# Altium footprint library LukaLIBRARY.PcbLib: 772 footprints (part 35 of 49)
Each footprint in its own frame and in the unit in brackets; x right, y up, seen from the top. Pads: shape width x height; smd on the part's side, far side on the other; paste and mask are expansions set on the pad; w line width, h text height; cw(c..) or ccw(c..) is an arc to the next point about the centre after c.
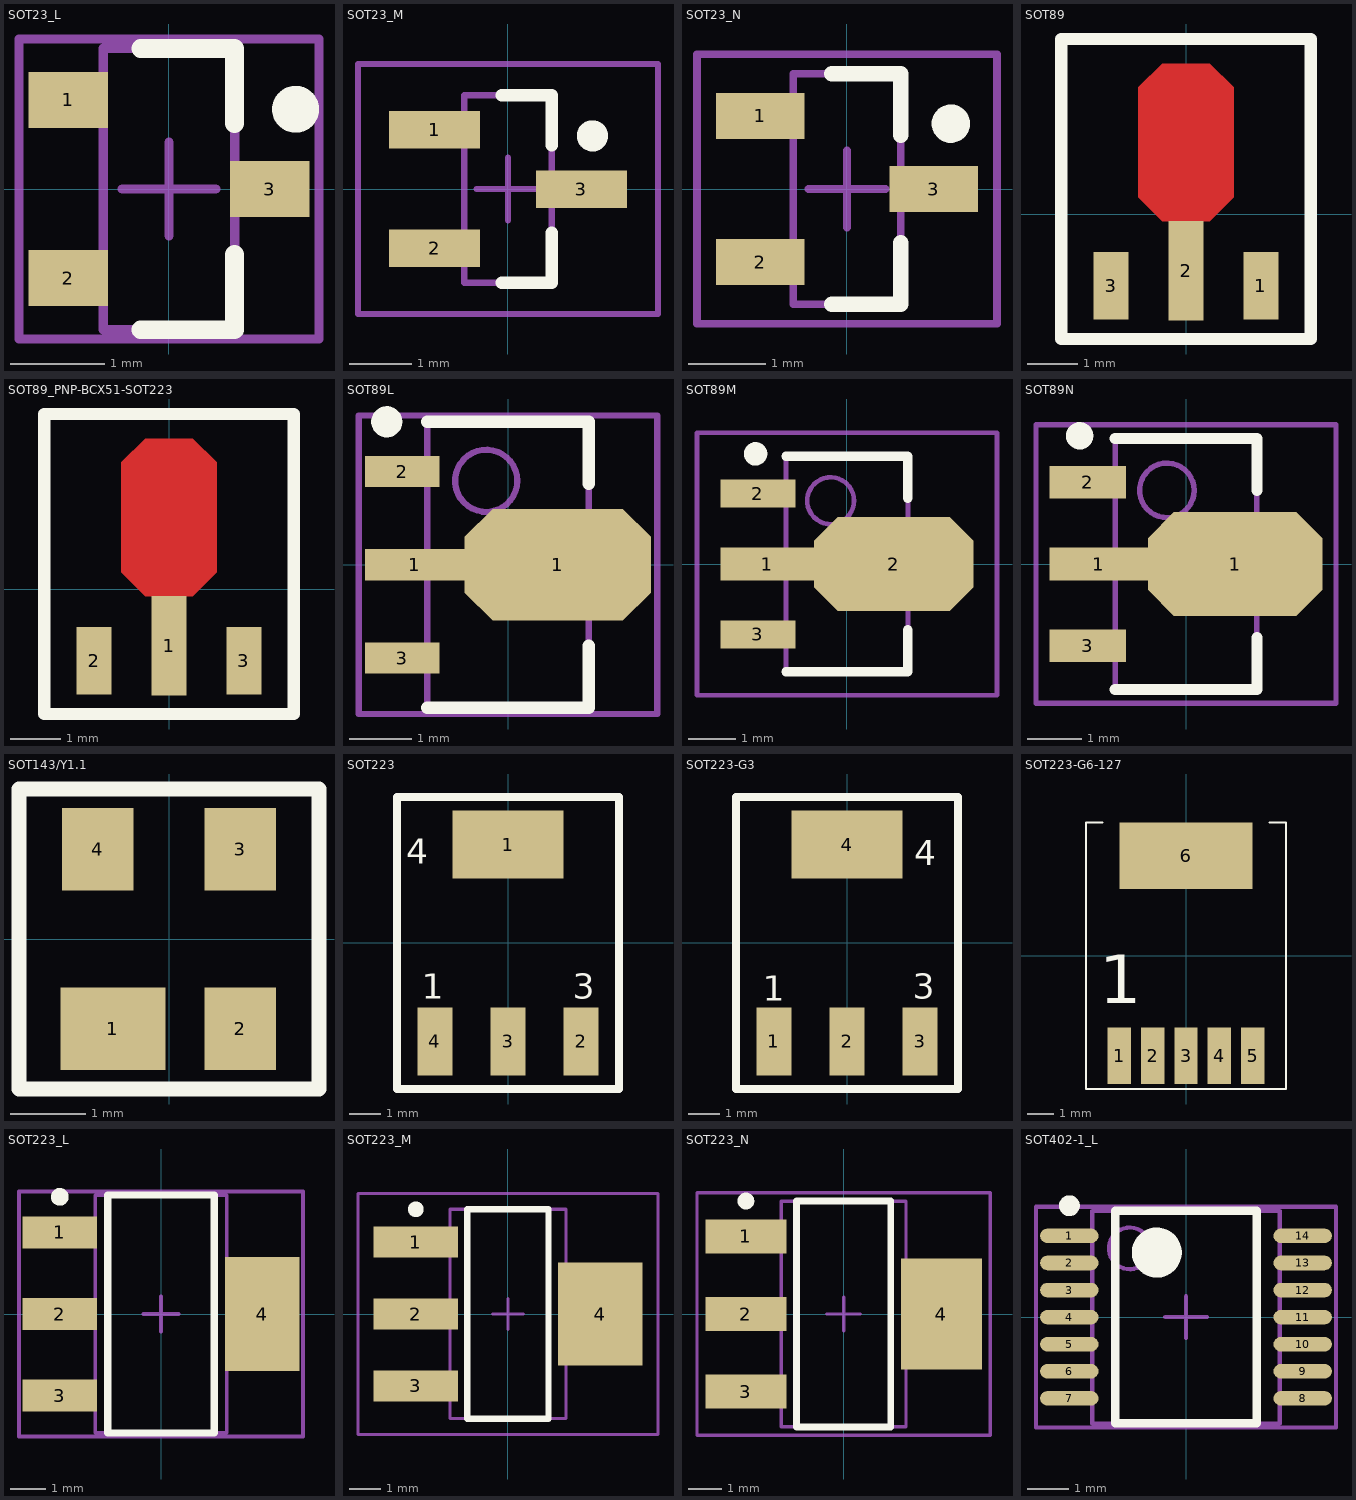
[diagram p34: the footprints below, top view; thin cyan lines are the x and y axes]

## SOT23_L [mm] "SOT23, 3-Leads, Body 2.9x1.3mm, Pitch 0.95mm, Lead Span 2.3mm - Reverse Pinning, IPC High Density"
height 1.1
pads (3):
  rect 0.85x0.6 smd: 1(-1.075,0.95) 2(-1.075,-0.95) 3(1.075,0)
Top Overlay:
  circle w0.25: c1.35,0.85 r0.125
  lines w0.2: -0.3,-1.5 0.7,-1.5 0.7,-0.7 ; -0.3,1.5 0.7,1.5 0.7,0.7
Mechanical 13:
  lines w0.1: -0.7,-1.5 0.7,-1.5 0.7,1.5 -0.7,1.5 -0.7,-1.5
Mechanical 15:
  lines w0.1: -0.5,0 0.5,0 ; 0,-0.5 0,0.5 ; -1.6,-1.6 1.6,-1.6 1.6,1.6 -1.6,1.6 -1.6,-1.6
3D body: height 1.1, standoff 0, extent -0.7,-1.5 0.7,1.5

## SOT23_M [mm] "SOT23, 3-Leads, Body 2.9x1.3mm, Pitch 0.95mm, Lead Span 2.3mm - Reverse Pinning, IPC Low Density"
height 1.1
pads (3):
  rect 1.45x0.6 smd: 1(-1.175,0.95) 2(-1.175,-0.95) 3(1.175,0)
Top Overlay:
  circle w0.25: c1.35,0.85 r0.125
  lines w0.2: -0.1,-1.5 0.7,-1.5 0.7,-0.7 ; -0.1,1.5 0.7,1.5 0.7,0.7
Mechanical 13:
  lines w0.1: -0.7,-1.5 0.7,-1.5 0.7,1.5 -0.7,1.5 -0.7,-1.5
Mechanical 15:
  lines w0.1: -0.5,0 0.5,0 ; 0,-0.5 0,0.5 ; -2.4,-2 2.4,-2 2.4,2 -2.4,2 -2.4,-2
3D body: height 1.1, standoff 0, extent -0.7,-1.5 0.7,1.5

## SOT23_N [mm] "SOT23, 3-Leads, Body 2.9x1.3mm, Pitch 0.95mm, Lead Span 2.3mm - Reverse Pinning, IPC Medium Density"
height 1.1
pads (3):
  rect 1.15x0.6 smd: 1(-1.125,0.95) 2(-1.125,-0.95) 3(1.125,0)
Top Overlay:
  circle w0.25: c1.35,0.85 r0.125
  lines w0.2: -0.2,-1.5 0.7,-1.5 0.7,-0.7 ; -0.2,1.5 0.7,1.5 0.7,0.7
Mechanical 13:
  lines w0.1: -0.7,-1.5 0.7,-1.5 0.7,1.5 -0.7,1.5 -0.7,-1.5
Mechanical 15:
  lines w0.1: -0.5,0 0.5,0 ; 0,-0.5 0,0.5 ; -1.95,-1.75 1.95,-1.75 1.95,1.75 -1.95,1.75 -1.95,-1.75
3D body: height 1.1, standoff 0, extent -0.7,-1.5 0.7,1.5

## SOT89 [mm]
pads (4):
  rect 0.7x1.35 smd: 1(1.5,-1.432) 3(-1.5,-1.432)
  rect 0.7x1.99 smd: 2(0,-1.138)
  round 0 smd paste-25.4 mask-25.4: 4(0,1.433)
Top Layer:
  region: 0.475,3.008 0.95,2.533 0.95,0.333 0.475,-0.142 -0.475,-0.142 -0.95,0.333 -0.95,2.533 -0.475,3.008
Top Overlay:
  lines w0.25: -2.5,-2.5 2.5,-2.5 2.5,3.5 -2.5,3.5 -2.5,-2.5
Top Paste:
  region: 0.475,3.008 0.95,2.533 0.95,0.333 0.475,-0.142 -0.475,-0.142 -0.95,0.333 -0.95,2.533 -0.475,3.008
Top Solder:
  region: 0.553,3.085 1.028,2.61 1.06,2.533 1.06,0.333 1.028,0.255 0.553,-0.22 0.475,-0.252 -0.475,-0.252 -0.553,-0.22 -1.028,0.255 -1.06,0.333 -1.06,2.533 -1.028,2.61 -0.553,3.085 -0.475,3.117 0.475,3.117

## SOT89_PNP-BCX51-SOT223 [mm]
pads (4):
  rect 0.7x1.99 smd: 1(0,-1.138)
  rect 0.7x1.35 smd: 2(-1.5,-1.432) 3(1.5,-1.432)
  round 0 smd paste-25.4 mask-25.4: 4(0,1.433)
Top Layer:
  region: 0.475,3.008 0.95,2.533 0.95,0.333 0.475,-0.142 -0.475,-0.142 -0.95,0.333 -0.95,2.533 -0.475,3.008
Top Overlay:
  lines w0.25: -2.5,-2.5 -2.5,3.5 2.5,3.5 2.5,-2.5 -2.5,-2.5
Top Paste:
  region: 0.475,3.008 0.95,2.533 0.95,0.333 0.475,-0.142 -0.475,-0.142 -0.95,0.333 -0.95,2.533 -0.475,3.008
Top Solder:
  region: 0.553,3.085 1.028,2.61 1.06,2.533 1.06,0.333 1.028,0.255 0.553,-0.22 0.475,-0.252 -0.475,-0.252 -0.553,-0.22 -1.028,0.255 -1.06,0.333 -1.06,2.533 -1.028,2.61 -0.553,3.085 -0.475,3.117 0.475,3.117

## SOT89L [mm] "SOT89, 3-Leads, Body 4.5x2.4 mm, Pitch 1.5mm, Lead Span 4.1mm, IPC High Density"
height 1.6
pads (4):
  rect 1.6x0.5 smd: 1(-1.5,0)
  oct 3x1.8 smd: 1(0.8,0)
  rect 1.2x0.5 smd: 2(-1.7,1.5) 3(-1.7,-1.5)
Top Overlay:
  circle w0.25: c-1.95,2.3 r0.125
  lines w0.2: -1.3,-2.3 1.3,-2.3 1.3,-1.3 ; -1.3,2.3 1.3,2.3 1.3,1.3
Mechanical 13:
  circle w0.1: c-0.35,1.35 r0.5
  lines w0.1: -1.3,-2.3 1.3,-2.3 1.3,2.3 -1.3,2.3 -1.3,-2.3
Mechanical 15:
  lines w0.1: -0.5,0 0.5,0 ; 0,-0.5 0,0.5 ; -2.4,-2.4 2.4,-2.4 2.4,2.4 -2.4,2.4 -2.4,-2.4
3D body: height 1.6, standoff 0, extent -1.3,-2.3 1.3,2.3

## SOT89M [mm] "SOT89, 3-Leads, Body 4.5x2.4 mm, Pitch 1.5mm, Lead Span 4.1mm, IPC Low Density"
height 1.6
pads (4):
  rect 2x0.7 smd: 1(-1.7,0)
  rect 1.6x0.6 smd: 2(-1.9,1.5) 3(-1.9,-1.5)
  oct 3.4x2 smd: 2(1,0)
Top Overlay:
  circle w0.25: c-1.95,2.35 r0.125
  lines w0.2: -1.3,-2.3 1.3,-2.3 1.3,-1.4 ; -1.3,2.3 1.3,2.3 1.3,1.4
Mechanical 13:
  circle w0.1: c-0.35,1.35 r0.5
  lines w0.1: -1.3,-2.3 -1.3,2.3 1.3,2.3 1.3,-2.3 -1.3,-2.3
Mechanical 15:
  lines w0.1: -0.5,0 0.5,0 ; 0,-0.5 0,0.5 ; -3.2,-2.8 -3.2,2.8 3.2,2.8 3.2,-2.8 -3.2,-2.8
3D body: height 1.6, standoff 0, extent -1.3,-2.3 1.3,2.3

## SOT89N [mm] "SOT89, 3-Leads, Body 4.5x2.4 mm, Pitch 1.5mm, Lead Span 4.1mm, IPC Medium Density"
height 1.6
pads (4):
  rect 1.8x0.6 smd: 1(-1.6,0)
  oct 3.2x1.9 smd: 1(0.9,0)
  rect 1.4x0.6 smd: 2(-1.8,1.5) 3(-1.8,-1.5)
Top Overlay:
  circle w0.25: c-1.95,2.35 r0.125
  lines w0.2: -1.3,-2.3 1.3,-2.3 1.3,-1.35 ; -1.3,2.3 1.3,2.3 1.3,1.35
Mechanical 13:
  circle w0.1: c-0.35,1.35 r0.5
  lines w0.1: -1.3,-2.3 -1.3,2.3 1.3,2.3 1.3,-2.3 -1.3,-2.3
Mechanical 15:
  lines w0.1: -0.5,0 0.5,0 ; 0,-0.5 0,0.5 ; -2.75,-2.55 -2.75,2.55 2.75,2.55 2.75,-2.55 -2.75,-2.55
3D body: height 1.6, standoff 0, extent -1.3,-2.3 1.3,2.3

## SOT143/Y1.1 [mm]
pads (4):
  rect 1.4x1.1 smd: 1(-0.75,-1.2)
  rect 0.95x1.1 smd: 2(0.95,-1.2) 3(0.95,1.2) 4(-0.95,1.2)
Top Overlay:
  lines w0.2: -2,-2 -2,2 2,2 2,-2 -2,-2

## SOT223 [mm]
pads (4):
  rect 3.5x2.15 smd: 1(0,3.1)
  rect 1.1x2.15 smd: 2(2.3,-3.1) 3(0,-3.1) 4(-2.3,-3.1)
Top Overlay:
  lines w0.25: -3.5,-4.6 -3.5,4.6 3.5,4.6 3.5,-4.6 -3.5,-4.6
  text "1" at -2.71,-1.75 h0.79
  text "4" at -3.21,2.5 h0.79
  text "3" at 2.04,-1.75 h0.79

## SOT223-G3 [mm]
pads (4):
  rect 1.1x2.15 smd mask-25.4: 1(-2.3,-3.1) 2(0,-3.1) 3(2.3,-3.1)
  rect 3.5x2.15 smd mask-25.4: 4(0,3.1)
Top Overlay:
  lines w0.25: -3.5,-4.6 3.5,-4.6 3.5,4.6 -3.5,4.6 -3.5,-4.6
  text "4" at 2.115,2.45 h0.79
  text "3" at 2.065,-1.75 h0.79
  text "1" at -2.66,-1.825 h0.79
Top Solder:
  region: -1.75,2.025 1.75,2.025 1.75,4.175 -1.75,4.175
  region: -0.55,-4.175 0.55,-4.175 0.55,-2.025 -0.55,-2.025
  region: 1.75,-4.175 2.85,-4.175 2.85,-2.025 1.75,-2.025
  region: -2.85,-4.175 -1.75,-4.175 -1.75,-2.025 -2.85,-2.025

## SOT223-G6-127 [mm]
pads (6):
  rect 0.889x2.15 smd mask-25.4: 1(-2.54,-3.81) 2(-1.27,-3.81) 3(0,-3.81) 4(1.27,-3.81) 5(2.54,-3.81)
  rect 5.08x2.54 smd mask-25.4: 6(0,3.81)
Top Overlay:
  lines w0.076: -3.175,5.08 -3.81,5.08 -3.81,-5.08 3.81,-5.08 3.81,5.08 3.175,5.08
  text "1" at -3.302,-2.413 h3.17
Top Solder:
  region: -2.54,2.54 2.54,2.54 2.54,5.08 -2.54,5.08
  region: -1.714,-4.885 -0.826,-4.885 -0.826,-2.735 -1.714,-2.735
  region: 2.095,-4.885 2.984,-4.885 2.984,-2.735 2.095,-2.735
  region: 0.826,-4.885 1.714,-4.885 1.714,-2.735 0.826,-2.735
  region: -0.445,-4.885 0.445,-4.885 0.445,-2.735 -0.445,-2.735
  region: -2.984,-4.885 -2.095,-4.885 -2.095,-2.735 -2.984,-2.735

## SOT223_L [mm] "SOT223, 4-Leads, Body 6.5x3.5mm, Pitch 2.3mm, Lead Span 7mm, IPC High Density"
height 1.7
pads (4):
  rect 2.1x0.9 smd: 1(-2.85,2.3) 2(-2.85,0) 3(-2.85,-2.3)
  rect 2.1x3.2 smd: 4(2.85,0)
Top Overlay:
  circle w0.25: c-2.85,3.3 r0.125
  lines w0.2: -1.5,-3.35 1.5,-3.35 1.5,3.35 -1.5,3.35 -1.5,-3.35
Mechanical 13:
  lines w0.1: -1.85,-3.35 1.85,-3.35 1.85,3.35 -1.85,3.35 -1.85,-3.35
Mechanical 15:
  lines w0.1: -0.5,0 0.5,0 ; 0,-0.5 0,0.5 ; -4,-3.45 4,-3.45 4,3.45 -4,3.45 -4,-3.45
3D body: height 1.7, standoff 0, extent -1.85,-3.35 1.85,3.35

## SOT223_M [mm] "SOT223, 4-Leads, Body 6.5x3.5mm, Pitch 2.3mm, Lead Span 7mm, IPC Low Density"
height 1.7
pads (4):
  rect 2.7x1 smd: 1(-2.95,2.3) 2(-2.95,0) 3(-2.95,-2.3)
  rect 2.7x3.3 smd: 4(2.95,0)
Top Overlay:
  circle w0.25: c-2.95,3.35 r0.125
  lines w0.2: -1.3,-3.35 -1.3,3.35 1.3,3.35 1.3,-3.35 -1.3,-3.35
Mechanical 13:
  lines w0.1: -1.85,-3.35 -1.85,3.35 1.85,3.35 1.85,-3.35 -1.85,-3.35
Mechanical 15:
  lines w0.1: -0.5,0 0.5,0 ; 0,-0.5 0,0.5 ; -4.8,-3.85 -4.8,3.85 4.8,3.85 4.8,-3.85 -4.8,-3.85
3D body: height 1.7, standoff 0, extent -1.85,-3.35 1.85,3.35

## SOT223_N [mm] "SOT223, 4-Leads, Body 6.5x3.5mm, Pitch 2.3mm, Lead Span 7mm, IPC Medium Density"
height 1.7
pads (4):
  rect 2.4x1 smd: 1(-2.9,2.3) 2(-2.9,0) 3(-2.9,-2.3)
  rect 2.4x3.3 smd: 4(2.9,0)
Top Overlay:
  circle w0.25: c-2.9,3.35 r0.125
  lines w0.2: -1.4,-3.35 1.4,-3.35 1.4,3.35 -1.4,3.35 -1.4,-3.35
Mechanical 13:
  lines w0.1: -1.85,-3.35 1.85,-3.35 1.85,3.35 -1.85,3.35 -1.85,-3.35
Mechanical 15:
  lines w0.1: -0.5,0 0.5,0 ; 0,-0.5 0,0.5 ; -4.35,-3.6 4.35,-3.6 4.35,3.6 -4.35,3.6 -4.35,-3.6
3D body: height 1.7, standoff 0, extent -1.85,-3.35 1.85,3.35

## SOT402-1_L [mm] "TSOP, 14-Leads, Body 5x4.4mm, Pitch 0.65mm, IPC High Density"
height 1.1
pads (14):
  oval 1.4x0.35 smd: 1(-2.8,1.95) 2(-2.8,1.3) 3(-2.8,0.65) 4(-2.8,0) 5(-2.8,-0.65) 6(-2.8,-1.3) 7(-2.8,-1.95) 8(2.8,-1.95) 9(2.8,-1.3) 10(2.8,-0.65) 11(2.8,0) 12(2.8,0.65) 13(2.8,1.3) 14(2.8,1.95)
Top Overlay:
  circle w0.25: c-2.8,2.675 r0.125
  circle w0.6: c-0.7,1.55 r0.3
  lines w0.2: -1.7,-2.55 -1.7,2.55 1.7,2.55 1.7,-2.55 -1.7,-2.55
Mechanical 13:
  circle w0.1: c-1.35,1.65 r0.5
  lines w0.1: -2.25,-2.55 -2.25,2.55 2.25,2.55 2.25,-2.55 -2.25,-2.55
Mechanical 15:
  lines w0.1: -0.5,0 0.5,0 ; 0,-0.5 0,0.5 ; -3.6,-2.65 -3.6,2.65 3.6,2.65 3.6,-2.65 -3.6,-2.65
3D body: height 1.1, standoff 0, extent -2.25,-2.55 2.25,2.55